# Altium footprint library ACTION_Others.pcblib: 88 footprints (part 3 of 6)
Each footprint in its own frame and in the unit in brackets; x right, y up, seen from the top. Pads: shape width x height; smd on the part's side, far side on the other; paste and mask are expansions set on the pad; w line width, h text height; cw(c..) or ccw(c..) is an arc to the next point about the centre after c.
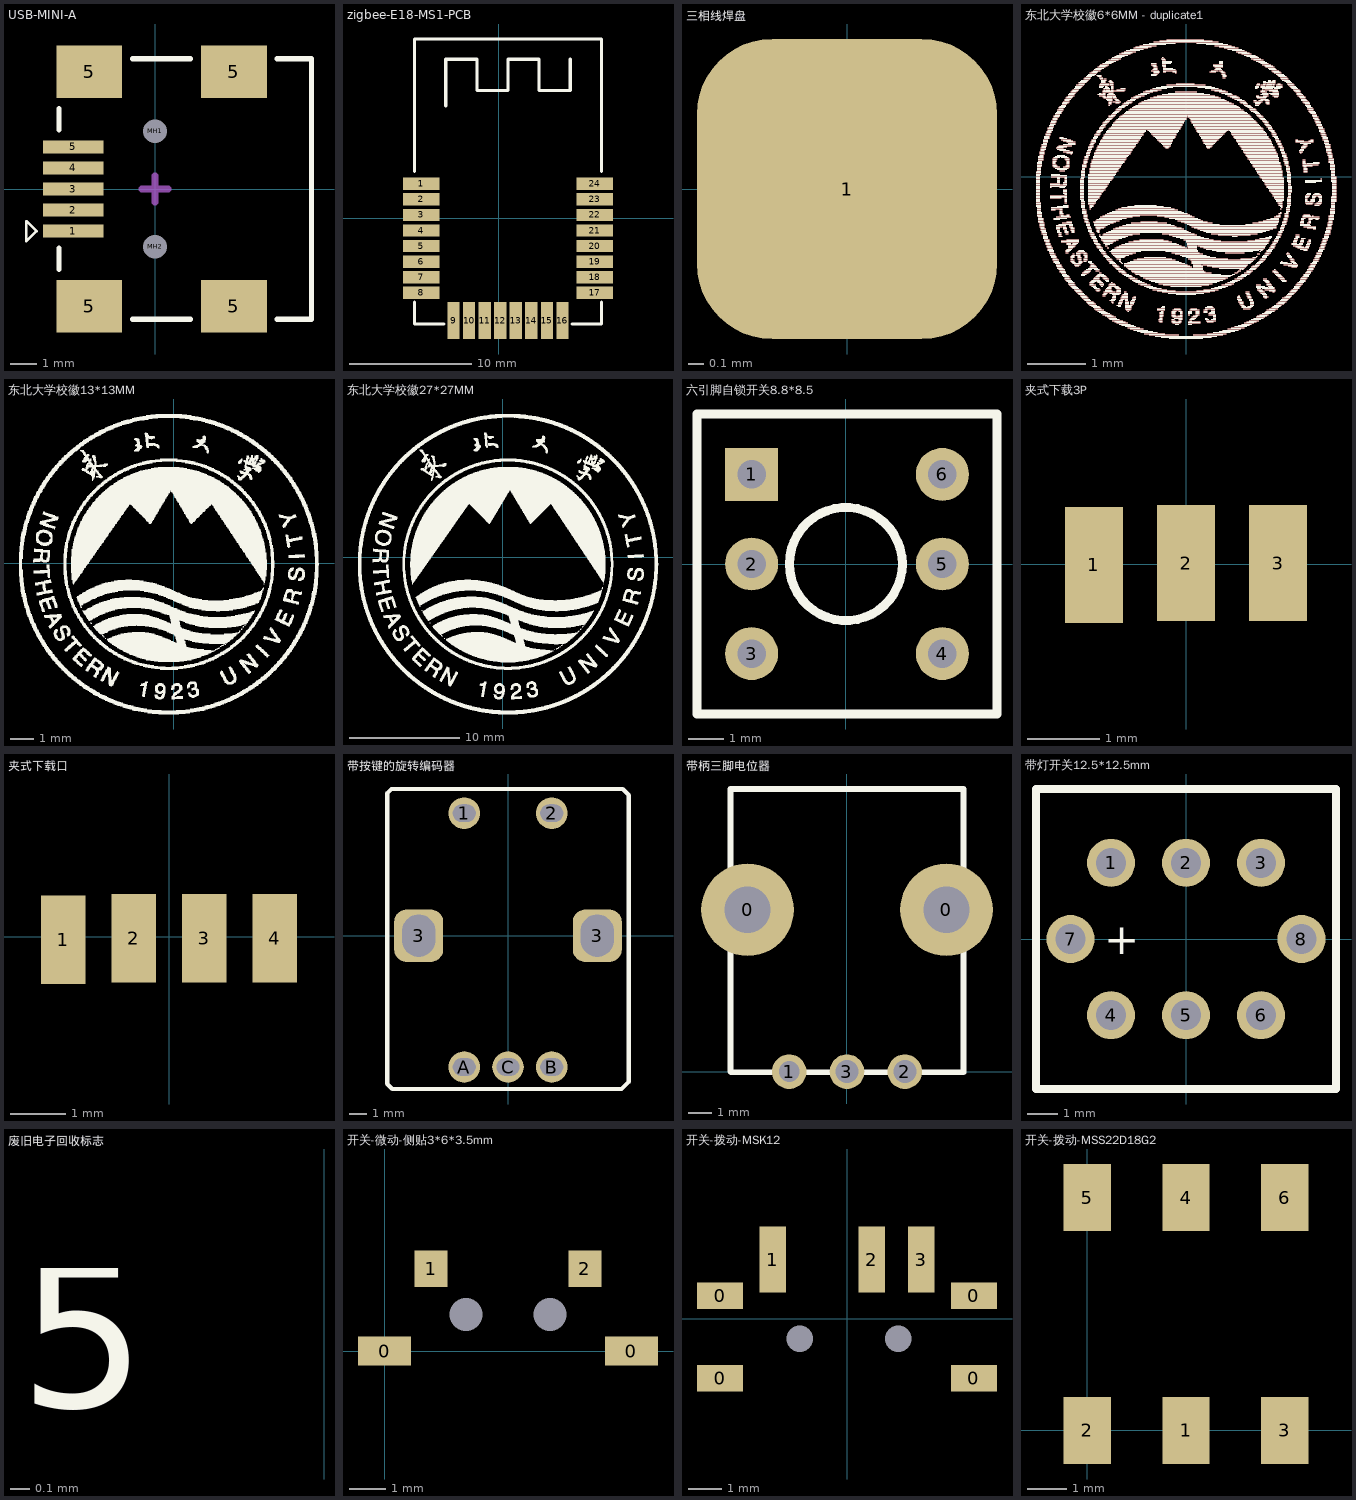
[diagram p2: the footprints below, top view; thin cyan lines are the x and y axes]

## USB-MINI-A [mm] "MINI型USB，7.9*7.5*4.1mm"
pads (11):
  rect 2.3x0.5 smd: 1(-3.108,-1.6) 2(-3.108,-0.8) 3(-3.108,0) 4(-3.108,0.8) 5(-3.108,1.6)
  rect 2.5x2 smd: 5(-2.5,-4.45) 5(-2.5,4.45) 5(3,-4.45) 5(3,4.45)
  round 0.6 hole 0.9 unplated: MH1(0,2.2) MH2(0,-2.2)
Top Overlay:
  lines w0.1: -4.886,-1.981 -4.505,-1.6 -4.886,-1.219 -4.886,-1.981
  lines w0.2: -3.65,-3.05 -3.65,-2.25 ; -3.65,2.25 -3.65,3.05 ; -0.85,-4.95 1.35,-4.95 ; -0.85,4.95 1.35,4.95 ; 4.65,-4.95 5.95,-4.95 5.95,4.95 4.65,4.95
Mechanical 15:
  lines w0.254: -0.508,0 0.508,0 ; 0,-0.508 0,0.508
3D body "USB MINI B型 贴片-": height 3.95, standoff -0.7, extent -3.7,-4.75 6,4.75

## zigbee-E18-MS1-PCB [mm] "zigbee模块"
pads (24):
  rect 3x1 smd: 1(-6.333,2.811) 2(-6.333,1.541) 3(-6.333,0.271) 4(-6.333,-0.999) 5(-6.333,-2.269) 6(-6.333,-3.539) 7(-6.333,-4.809) 8(-6.333,-6.079) 17(7.807,-6.079) 18(7.807,-4.809) 19(7.807,-3.539) 20(7.807,-2.269) 21(7.807,-0.999) 22(7.807,0.271) 23(7.807,1.541) 24(7.807,2.811)
  rect 1x3 smd: 9(-3.708,-8.348) 10(-2.438,-8.348) 11(-1.168,-8.348) 12(0.102,-8.348) 13(1.372,-8.348) 14(2.642,-8.348) 15(3.912,-8.348) 16(5.182,-8.348)
Top Overlay:
  lines w0.254: -6.883,-6.841 -6.883,-7.121 -6.883,-8.62 -4.47,-8.62 ; -6.883,3.827 -6.883,14.622 8.357,14.622 8.357,3.827 ; -4.343,9.161 -4.343,12.971 -1.803,12.971 -1.803,10.431 0.737,10.431 0.737,12.971 3.277,12.971 3.277,10.431 5.817,10.431 5.817,12.971 ; 5.944,-8.619 8.357,-8.619 8.357,-6.841

## 三相线焊盘 [mm]
pads (1):
  rrect50% 2x2 smd: 1(0,0)

## 东北大学校徽6*6MM - duplicate1 [mm]
height 1.22
Top Layer:
  drawing of 1885 lines, arcs and shapes, not listed
Top Overlay:
  drawing of 1885 lines, arcs and shapes, not listed

## 东北大学校徽13*13MM [mm]
Top Overlay:
  drawing of 3824 lines, arcs and shapes, not listed

## 东北大学校徽27*27MM [mm]
Top Overlay:
  drawing of 8197 lines, arcs and shapes, not listed

## 六引脚自锁开关8.8*8.5 [mm]
pads (6):
  rect 1.5x1.5 hole 0.8: 1(-2.667,2.54)
  round 1.5 hole 0.8: 2(-2.667,0) 3(-2.667,-2.54) 4(2.733,-2.54) 5(2.733,0) 6(2.733,2.54)
Top Overlay:
  circle w0.254: c0,0 r1.6
  lines w0.254: -4.217,-4.25 -4.217,4.25 4.283,4.25 4.283,-4.25 -4.217,-4.25
3D body "User Library-Switch_6pin.step": height 14.05, standoff -2.95, extent -4.123,-4.326 4.377,4.174

## 夹式下载3P [mm]
pads (3):
  rect 0.8x1.6 smd: 1(-1.27,-0.013) 2(0,0.013) 3(1.27,0.013)

## 夹式下载口 [mm]
pads (4):
  rect 0.8x1.6 smd: 1(-1.905,-0.051) 2(-0.635,-0.025) 3(0.635,-0.025) 4(1.905,-0.025)

## 带按键的旋转编码器 [mm]
pads (7):
  round 1.8 hole 1 slot 1.3 at 0 deg: 1(-2.5,7) 2(2.5,7) A(-2.5,-7.5) B(2.5,-7.5) C(0,-7.5)
  rrect50% 2.8x3 hole 2.4 slot 1.9 at 0 deg: 3(-5.1,0) 3(5.1,0)
Top Overlay:
  lines w0.254: -6.909,-7.747 -6.909,-8.458 -6.61,-8.757 6.483,-8.757 6.909,-8.331 6.909,8.026 6.553,8.382 6.147,8.382 -6.655,8.382 -6.909,8.128 -6.909,-7.696
3D body "User Library-EC11B15244.STEP": height 31.6, standoff -3.47, extent -6.549,-7.696 6.549,7.429

## 带柄三脚电位器 [mm] "【三脚B103变频器 电机调速器 操作面板调速旋?"
pads (5):
  round 4 hole 2 square: 0(-4.3,7) 0(4.3,7)
  round 1.5 hole 0.9: 1(-2.5,0)
  round 1.5 hole 1: 2(2.5,0) 3(0,0)
Top Overlay:
  lines w0.254: -5.029,0 -5.029,12.217 5.029,12.217 5.029,0.025 ; -5.022,-0.025 5.029,-0.025

## 带灯开关12.5*12.5mm [mm]
pads (8):
  round 1.6 hole 1: 1(-2.5,2.54) 2(0,2.54) 3(2.5,2.54) 4(-2.5,-2.54) 5(0,-2.54) 6(2.5,-2.54) 7(-3.85,0) 8(3.85,0)
Top Overlay:
  lines w0.254: -5,-5 -5,5 5,5 5,-5 -5,-5
  text "+" at -2.718,-0.508 h1.02
3D body: height 10.85, standoff 0, extent -5.017,-5.004 5.017,5.004

## 废旧电子回收标志 [mm]
Top Overlay:
  text "5" at -1.549,-2.565 h1.52

## 开关-微动-侧贴3*6*3.5mm [mm]
pads (6):
  rect 1.45x0.8 smd: 0(0,0) 0(6.75,0)
  round 0 hole 0.9: 0(2.225,1) 0(4.525,1)
  rect 0.9x1 smd: 1(1.275,2.25) 2(5.475,2.25)
3D body "User Library-Tact_switchSide_sticker3x6x3_5_-.step": height 3.5, standoff -0.8, extent -0.522,-1.145 7.278,2.735

## 开关-拨动-MSK12 [mm] "贴片拨码开关"
pads (9):
  rect 1.4x0.8 smd: 0(-3.85,-1.8) 0(-3.85,0.7) 0(3.85,-1.8) 0(3.85,0.7)
  round 0 hole 0.8: 0(-1.437,-0.606) 0(1.56,-0.606)
  rect 0.8x2 smd: 1(-2.25,1.8) 2(0.75,1.8) 3(2.25,1.8)
3D body "User Library-Slide-SW_SPDT.step": height 1.4, standoff -0.55, extent -3.875,-3.499 4.025,1.896

## 开关-拨动-MSS22D18G2 [mm] "6脚"
pads (6):
  rect 1.2x1.7 smd: 1(2.5,0) 2(0,0) 3(5,0) 4(2.5,5.9) 5(0,5.9) 6(5,5.9)
3D body "User Library-SlideSwitchMSK08-2.step": height 3.6, standoff -0.5, extent -1.111,-0.129 6.089,5.971